# Altium footprint library SMDLibrary.PcbLib: 306 footprints (part 16 of 20)
Each footprint in its own frame and in the unit in brackets; x right, y up, seen from the top. Pads: shape width x height; smd on the part's side, far side on the other; paste and mask are expansions set on the pad; w line width, h text height; cw(c..) or ccw(c..) is an arc to the next point about the centre after c.
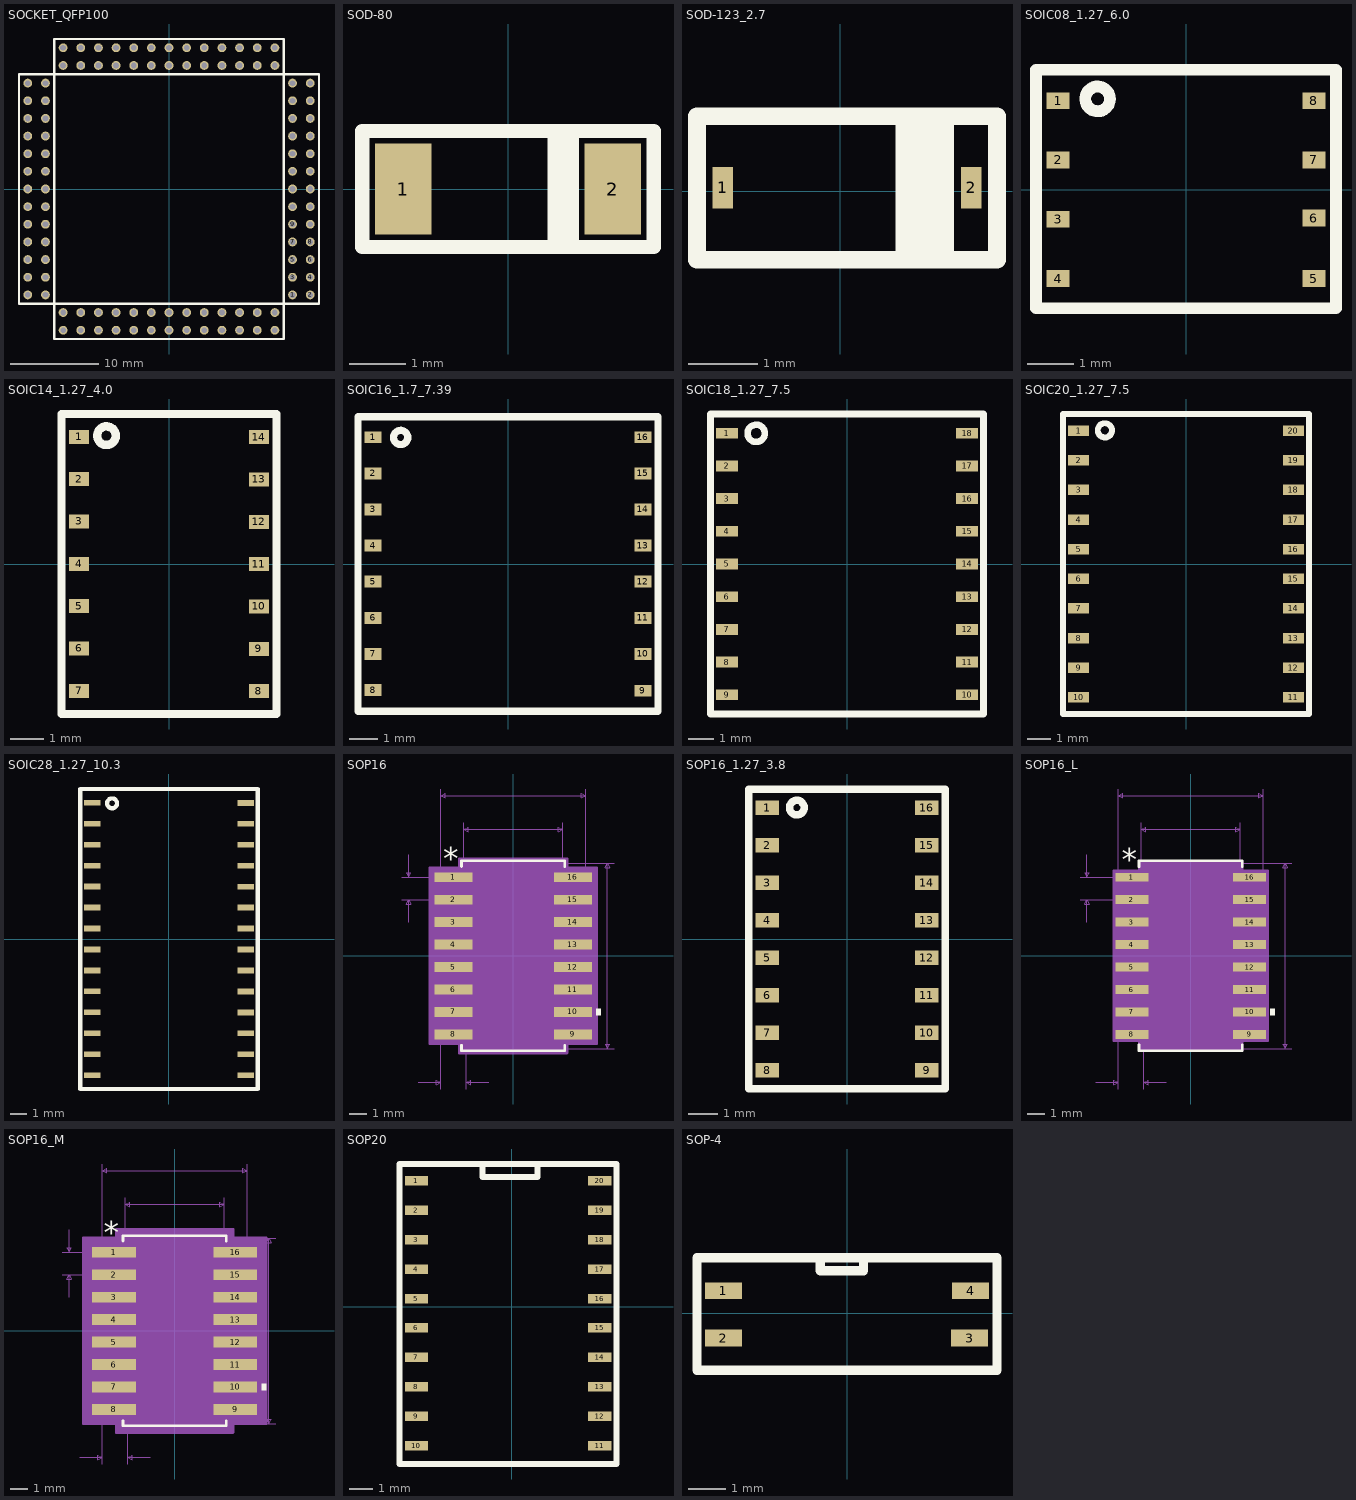
[diagram p15: the footprints below, top view; thin cyan lines are the x and y axes]

## SOCKET_QFP100 [mm]
pads (104):
  round 1 hole 0.65: 1(14,-12) 2(16,-12) 3(14,-10) 4(16,-10) 5(14,-8) 6(16,-8) 7(14,-6) 8(16,-6) 9(14,-4) 10(16,-4) 11(14,-2) 12(16,-2) 13(14,0) 14(16,0) 15(14,2) 16(16,2) 17(14,4) 18(16,4) 19(14,6) 20(16,6) 21(14,8) 22(16,8) 23(14,10) 24(16,10) 25(14,12) 26(12,14) 27(12,16) 28(10,14) 29(10,16) 30(8,14) 31(8,16) 32(6,14) 33(6,16) 34(4,14) 35(4,16) 36(2,14) 37(2,16) 38(0,14) 39(0,16) 40(-2,14) 41(-2,16) 42(-4,14) 43(-4,16) 44(-6,14) 45(-6,16) 46(-8,14) 47(-8,16) 48(-10,14) 49(-10,16) 50(-12,14) 51(-14,12) 52(-16,12) 53(-14,10) 54(-16,10) 55(-14,8) 56(-16,8) 57(-14,6) 58(-16,6) 59(-14,4) 60(-16,4) 61(-14,2) 62(-16,2) 63(-14,0) 64(-16,0) 65(-14,-2) 66(-16,-2) 67(-14,-4) 68(-16,-4) 69(-14,-6) 70(-16,-6) 71(-14,-8) 72(-16,-8) 73(-14,-10) 74(-16,-10) 75(-14,-12) 76(-12,-14) 77(-12,-16) 78(-10,-14) 79(-10,-16) 80(-8,-14) 81(-8,-16) 82(-6,-14) 83(-6,-16) 84(-4,-14) 85(-4,-16) 86(-2,-14) 87(-2,-16) 88(0,-14) 89(0,-16) 90(2,-14) 91(2,-16) 92(4,-14) 93(4,-16) 94(6,-14) 95(6,-16) 96(8,-14) 97(8,-16) 98(10,-14) 99(10,-16) 100(12,-14) NC(-16,-12) NC(-12,16) NC(12,-16) NC(16,12)
Top Overlay:
  lines w0.254: -2,13 2,13 ; 2,-13 -2,-13 ; -17,-13 -17,13 -13,13 ; -17,-13 -17,-13 ; -17,-13 -13,-13 ; -13,-13 -13,13 ; -13,-13 -13,-13 ; -13,-13 13,-13 ; -13,-13 -13,-17 13,-17 ; -13,13 13,13 ; -13,13 -13,17 ; -13,13 -13,13 ; -13,17 13,17 13,13 ; -13,17 -13,17 ; -2,-13 -2,-13 ; 2,13 2,13 ; 13,-17 13,-17 ; 13,-17 13,-13 ; 13,-13 13,-13 ; 13,-13 13,13 ; 13,-13 17,-13 17,13 ; 13,13 17,13 ; 13,13 13,13 ; 17,13 17,13
3D body "pin header 1x1 pitch 2mm heigth 5mm.stp": height 6.01, standoff -2.69, extent 11,15 13,17
3D body "pin header 1x1 pitch 2mm heigth 5mm.stp": height 6.01, standoff -2.69, extent -1,15 1,17
3D body "pin header 1x1 pitch 2mm heigth 5mm.stp": height 6.01, standoff -2.69, extent 1,15 3,17
3D body "pin header 1x1 pitch 2mm heigth 5mm.stp": height 6.01, standoff -2.69, extent 3,15 5,17
3D body "pin header 1x1 pitch 2mm heigth 5mm.stp": height 6.01, standoff -2.69, extent 5,15 7,17
3D body "pin header 1x1 pitch 2mm heigth 5mm.stp": height 6.01, standoff -2.69, extent 7,15 9,17
3D body "pin header 1x1 pitch 2mm heigth 5mm.stp": height 6.01, standoff -2.69, extent 9,15 11,17
3D body "pin header 1x1 pitch 2mm heigth 5mm.stp": height 6.01, standoff -2.69, extent -3,15 -1,17
3D body "pin header 1x1 pitch 2mm heigth 5mm.stp": height 6.01, standoff -2.69, extent -5,15 -3,17
3D body "pin header 1x1 pitch 2mm heigth 5mm.stp": height 6.01, standoff -2.69, extent -7,15 -5,17
3D body "pin header 1x1 pitch 2mm heigth 5mm.stp": height 6.01, standoff -2.69, extent -9,15 -7,17
3D body "pin header 1x1 pitch 2mm heigth 5mm.stp": height 6.01, standoff -2.69, extent -11,15 -9,17
3D body "pin header 1x1 pitch 2mm heigth 5mm.stp": height 6.01, standoff -2.69, extent -13,15 -11,17
3D body "pin header 1x1 pitch 2mm heigth 5mm.stp": height 6.01, standoff -2.69, extent 13,-13 15,-11
3D body "pin header 1x1 pitch 2mm heigth 5mm.stp": height 6.01, standoff -2.69, extent 15,-13 17,-11
3D body "pin header 1x1 pitch 2mm heigth 5mm.stp": height 6.01, standoff -2.69, extent 13,-1 15,1
3D body "pin header 1x1 pitch 2mm heigth 5mm.stp": height 6.01, standoff -2.69, extent 15,-1 17,1
3D body "pin header 1x1 pitch 2mm heigth 5mm.stp": height 6.01, standoff -2.69, extent 13,-3 15,-1
3D body "pin header 1x1 pitch 2mm heigth 5mm.stp": height 6.01, standoff -2.69, extent 15,-3 17,-1
3D body "pin header 1x1 pitch 2mm heigth 5mm.stp": height 6.01, standoff -2.69, extent 13,-5 15,-3
3D body "pin header 1x1 pitch 2mm heigth 5mm.stp": height 6.01, standoff -2.69, extent 13,-7 15,-5
3D body "pin header 1x1 pitch 2mm heigth 5mm.stp": height 6.01, standoff -2.69, extent 13,-9 15,-7
3D body "pin header 1x1 pitch 2mm heigth 5mm.stp": height 6.01, standoff -2.69, extent 15,-5 17,-3
3D body "pin header 1x1 pitch 2mm heigth 5mm.stp": height 6.01, standoff -2.69, extent 15,-7 17,-5
3D body "pin header 1x1 pitch 2mm heigth 5mm.stp": height 6.01, standoff -2.69, extent 15,-9 17,-7
3D body "pin header 1x1 pitch 2mm heigth 5mm.stp": height 6.01, standoff -2.69, extent 15,-11 17,-9
3D body "pin header 1x1 pitch 2mm heigth 5mm.stp": height 6.01, standoff -2.69, extent 13,-11 15,-9
3D body "pin header 1x1 pitch 2mm heigth 5mm.stp": height 6.01, standoff -2.69, extent 13,1 15,3
3D body "pin header 1x1 pitch 2mm heigth 5mm.stp": height 6.01, standoff -2.69, extent 15,1 17,3
3D body "pin header 1x1 pitch 2mm heigth 5mm.stp": height 6.01, standoff -2.69, extent 15,3 17,5
3D body "pin header 1x1 pitch 2mm heigth 5mm.stp": height 6.01, standoff -2.69, extent 15,5 17,7
3D body "pin header 1x1 pitch 2mm heigth 5mm.stp": height 6.01, standoff -2.69, extent 15,7 17,9
3D body "pin header 1x1 pitch 2mm heigth 5mm.stp": height 6.01, standoff -2.69, extent 13,3 15,5
3D body "pin header 1x1 pitch 2mm heigth 5mm.stp": height 6.01, standoff -2.69, extent 13,5 15,7
3D body "pin header 1x1 pitch 2mm heigth 5mm.stp": height 6.01, standoff -2.69, extent 13,7 15,9
3D body "pin header 1x1 pitch 2mm heigth 5mm.stp": height 6.01, standoff -2.69, extent 15,9 17,11
3D body "pin header 1x1 pitch 2mm heigth 5mm.stp": height 6.01, standoff -2.69, extent 13,9 15,11
3D body "pin header 1x1 pitch 2mm heigth 5mm.stp": height 6.01, standoff -2.69, extent 15,11 17,13
3D body "pin header 1x1 pitch 2mm heigth 5mm.stp": height 6.01, standoff -2.69, extent 13,11 15,13
3D body "pin header 1x1 pitch 2mm heigth 5mm.stp": height 6.01, standoff -2.69, extent 11,13 13,15
3D body "pin header 1x1 pitch 2mm heigth 5mm.stp": height 6.01, standoff -2.69, extent -1,13 1,15
3D body "pin header 1x1 pitch 2mm heigth 5mm.stp": height 6.01, standoff -2.69, extent 1,13 3,15
3D body "pin header 1x1 pitch 2mm heigth 5mm.stp": height 6.01, standoff -2.69, extent 3,13 5,15
3D body "pin header 1x1 pitch 2mm heigth 5mm.stp": height 6.01, standoff -2.69, extent 5,13 7,15
3D body "pin header 1x1 pitch 2mm heigth 5mm.stp": height 6.01, standoff -2.69, extent 7,13 9,15
3D body "pin header 1x1 pitch 2mm heigth 5mm.stp": height 6.01, standoff -2.69, extent 9,13 11,15
3D body "pin header 1x1 pitch 2mm heigth 5mm.stp": height 6.01, standoff -2.69, extent -3,13 -1,15
3D body "pin header 1x1 pitch 2mm heigth 5mm.stp": height 6.01, standoff -2.69, extent -5,13 -3,15
3D body "pin header 1x1 pitch 2mm heigth 5mm.stp": height 6.01, standoff -2.69, extent -7,13 -5,15
3D body "pin header 1x1 pitch 2mm heigth 5mm.stp": height 6.01, standoff -2.69, extent -9,13 -7,15
3D body "pin header 1x1 pitch 2mm heigth 5mm.stp": height 6.01, standoff -2.69, extent -11,13 -9,15
3D body "pin header 1x1 pitch 2mm heigth 5mm.stp": height 6.01, standoff -2.69, extent -13,13 -11,15
3D body "pin header 1x1 pitch 2mm heigth 5mm.stp": height 6.01, standoff -2.69, extent -15,11 -13,13
3D body "pin header 1x1 pitch 2mm heigth 5mm.stp": height 6.01, standoff -2.69, extent -17,11 -15,13
3D body "pin header 1x1 pitch 2mm heigth 5mm.stp": height 6.01, standoff -2.69, extent -15,-1 -13,1
3D body "pin header 1x1 pitch 2mm heigth 5mm.stp": height 6.01, standoff -2.69, extent -17,-1 -15,1
3D body "pin header 1x1 pitch 2mm heigth 5mm.stp": height 6.01, standoff -2.69, extent -15,1 -13,3
3D body "pin header 1x1 pitch 2mm heigth 5mm.stp": height 6.01, standoff -2.69, extent -17,1 -15,3
3D body "pin header 1x1 pitch 2mm heigth 5mm.stp": height 6.01, standoff -2.69, extent -15,3 -13,5
3D body "pin header 1x1 pitch 2mm heigth 5mm.stp": height 6.01, standoff -2.69, extent -15,5 -13,7
3D body "pin header 1x1 pitch 2mm heigth 5mm.stp": height 6.01, standoff -2.69, extent -15,7 -13,9
3D body "pin header 1x1 pitch 2mm heigth 5mm.stp": height 6.01, standoff -2.69, extent -17,3 -15,5
3D body "pin header 1x1 pitch 2mm heigth 5mm.stp": height 6.01, standoff -2.69, extent -17,5 -15,7
3D body "pin header 1x1 pitch 2mm heigth 5mm.stp": height 6.01, standoff -2.69, extent -17,7 -15,9
3D body "pin header 1x1 pitch 2mm heigth 5mm.stp": height 6.01, standoff -2.69, extent -17,9 -15,11
3D body "pin header 1x1 pitch 2mm heigth 5mm.stp": height 6.01, standoff -2.69, extent -15,9 -13,11
3D body "pin header 1x1 pitch 2mm heigth 5mm.stp": height 6.01, standoff -2.69, extent -15,-3 -13,-1
3D body "pin header 1x1 pitch 2mm heigth 5mm.stp": height 6.01, standoff -2.69, extent -17,-3 -15,-1
3D body "pin header 1x1 pitch 2mm heigth 5mm.stp": height 6.01, standoff -2.69, extent -17,-5 -15,-3
3D body "pin header 1x1 pitch 2mm heigth 5mm.stp": height 6.01, standoff -2.69, extent -17,-7 -15,-5
3D body "pin header 1x1 pitch 2mm heigth 5mm.stp": height 6.01, standoff -2.69, extent -17,-9 -15,-7
3D body "pin header 1x1 pitch 2mm heigth 5mm.stp": height 6.01, standoff -2.69, extent -15,-5 -13,-3
3D body "pin header 1x1 pitch 2mm heigth 5mm.stp": height 6.01, standoff -2.69, extent -15,-7 -13,-5
3D body "pin header 1x1 pitch 2mm heigth 5mm.stp": height 6.01, standoff -2.69, extent -15,-9 -13,-7
3D body "pin header 1x1 pitch 2mm heigth 5mm.stp": height 6.01, standoff -2.69, extent -17,-11 -15,-9
3D body "pin header 1x1 pitch 2mm heigth 5mm.stp": height 6.01, standoff -2.69, extent -15,-11 -13,-9
3D body "pin header 1x1 pitch 2mm heigth 5mm.stp": height 6.01, standoff -2.69, extent -17,-13 -15,-11
3D body "pin header 1x1 pitch 2mm heigth 5mm.stp": height 6.01, standoff -2.69, extent -15,-13 -13,-11
3D body "pin header 1x1 pitch 2mm heigth 5mm.stp": height 6.01, standoff -2.69, extent -13,-15 -11,-13
3D body "pin header 1x1 pitch 2mm heigth 5mm.stp": height 6.01, standoff -2.69, extent -13,-17 -11,-15
3D body "pin header 1x1 pitch 2mm heigth 5mm.stp": height 6.01, standoff -2.69, extent -1,-15 1,-13
3D body "pin header 1x1 pitch 2mm heigth 5mm.stp": height 6.01, standoff -2.69, extent -1,-17 1,-15
3D body "pin header 1x1 pitch 2mm heigth 5mm.stp": height 6.01, standoff -2.69, extent -3,-15 -1,-13
3D body "pin header 1x1 pitch 2mm heigth 5mm.stp": height 6.01, standoff -2.69, extent -3,-17 -1,-15
3D body "pin header 1x1 pitch 2mm heigth 5mm.stp": height 6.01, standoff -2.69, extent -5,-15 -3,-13
3D body "pin header 1x1 pitch 2mm heigth 5mm.stp": height 6.01, standoff -2.69, extent -7,-15 -5,-13
3D body "pin header 1x1 pitch 2mm heigth 5mm.stp": height 6.01, standoff -2.69, extent -9,-15 -7,-13
3D body "pin header 1x1 pitch 2mm heigth 5mm.stp": height 6.01, standoff -2.69, extent -5,-17 -3,-15
3D body "pin header 1x1 pitch 2mm heigth 5mm.stp": height 6.01, standoff -2.69, extent -7,-17 -5,-15
3D body "pin header 1x1 pitch 2mm heigth 5mm.stp": height 6.01, standoff -2.69, extent -9,-17 -7,-15
3D body "pin header 1x1 pitch 2mm heigth 5mm.stp": height 6.01, standoff -2.69, extent -11,-17 -9,-15
3D body "pin header 1x1 pitch 2mm heigth 5mm.stp": height 6.01, standoff -2.69, extent -11,-15 -9,-13
3D body "pin header 1x1 pitch 2mm heigth 5mm.stp": height 6.01, standoff -2.69, extent 1,-15 3,-13
3D body "pin header 1x1 pitch 2mm heigth 5mm.stp": height 6.01, standoff -2.69, extent 1,-17 3,-15
3D body "pin header 1x1 pitch 2mm heigth 5mm.stp": height 6.01, standoff -2.69, extent 3,-17 5,-15
3D body "pin header 1x1 pitch 2mm heigth 5mm.stp": height 6.01, standoff -2.69, extent 5,-17 7,-15
3D body "pin header 1x1 pitch 2mm heigth 5mm.stp": height 6.01, standoff -2.69, extent 7,-17 9,-15
3D body "pin header 1x1 pitch 2mm heigth 5mm.stp": height 6.01, standoff -2.69, extent 3,-15 5,-13
3D body "pin header 1x1 pitch 2mm heigth 5mm.stp": height 6.01, standoff -2.69, extent 5,-15 7,-13
3D body "pin header 1x1 pitch 2mm heigth 5mm.stp": height 6.01, standoff -2.69, extent 7,-15 9,-13
3D body "pin header 1x1 pitch 2mm heigth 5mm.stp": height 6.01, standoff -2.69, extent 9,-17 11,-15
3D body "pin header 1x1 pitch 2mm heigth 5mm.stp": height 6.01, standoff -2.69, extent 9,-15 11,-13
3D body "pin header 1x1 pitch 2mm heigth 5mm.stp": height 6.01, standoff -2.69, extent 11,-17 13,-15
3D body "pin header 1x1 pitch 2mm heigth 5mm.stp": height 6.01, standoff -2.69, extent 11,-15 13,-13

## SOD-80 [mm]
pads (2):
  rect 1x1.6 smd: 1(-1.85,0) 2(1.85,0)
Top Overlay:
  rectangle: 0.7,-0.9 1.25,0.925
  lines w0.254: -2.575,-1.025 -2.575,1.025 2.575,1.025 2.575,-1.025 -2.575,-1.025
3D body "User Library-MiniMelf-2.STEP": height 1.6, standoff 0, extent -1.82,-0.8 1.88,0.8

## SOD-123_2.7 [mm]
pads (2):
  rect 0.3x0.6 smd: 1(-1.7,0.05) 2(1.9,0.05)
Top Overlay:
  rectangle: 0.8,-1.025 1.65,1.075
  lines w0.254: -2.075,-0.991 2.275,-0.991 2.275,1.092 -2.075,1.092 -2.075,-0.991
3D body "User Library-SOD123-1.STEP": height 1.18, standoff 0, extent -1.85,-0.85 2.05,0.95

## SOIC08_1.27_6.0 [mm]
pads (8):
  rect 0.5x0.36 smd: 1(-2.75,1.913) 2(-2.75,0.637) 3(-2.75,-0.637) 4(-2.75,-1.913) 5(2.75,-1.913) 6(2.75,-0.613) 7(2.75,0.637) 8(2.75,1.913)
Top Overlay:
  circle w0.254: c-1.9,1.95 r0.266
  lines w0.254: -3.225,-2.553 3.225,-2.553 3.225,2.578 -3.225,2.578 -3.225,-2.553
3D body "User Library-SOIC-8-1.STEP": height 1.75, standoff 0, extent -3,-2.45 3,2.45

## SOIC14_1.27_4.0 [mm]
pads (14):
  rect 0.6x0.42 smd: 1(-2.7,3.815) 2(-2.7,2.545) 3(-2.7,1.275) 4(-2.7,0.005) 5(-2.7,-1.265) 6(-2.7,-2.535) 7(-2.7,-3.805) 8(2.7,-3.815) 9(2.7,-2.545) 10(2.7,-1.275) 11(2.7,-0.005) 12(2.7,1.265) 13(2.7,2.535) 14(2.7,3.805)
Top Overlay:
  circle w0.254: c-1.875,3.85 r0.28
  lines w0.254: -3.225,-4.5 -3.225,4.5 3.225,4.5 3.225,-4.5 -3.225,-4.5
3D body "User Library-SOIC-14.STEP": height 1.75, standoff 0, extent -3,-4.375 3,4.375

## SOIC16_1.7_7.39 [mm]
pads (16):
  rect 0.6x0.42 smd: 1(-4.74,4.457) 2(-4.74,3.187) 3(-4.74,1.917) 4(-4.74,0.647) 5(-4.74,-0.623) 6(-4.74,-1.893) 7(-4.74,-3.163) 8(-4.74,-4.433) 9(4.74,-4.457) 10(4.74,-3.162) 11(4.74,-1.892) 12(4.74,-0.622) 13(4.74,0.648) 14(4.74,1.918) 15(4.74,3.188) 16(4.74,4.458)
Top Overlay:
  circle w0.254: c-3.775,4.45 r0.25
  lines w0.254: -5.275,-5.175 -5.275,5.175 5.275,5.175 5.275,-5.175 -5.275,-5.175
3D body "SOIC16 wide.stp": height 2, standoff 0, extent -5.082,-5.04 5.081,5.04

## SOIC18_1.27_7.5 [mm]
pads (18):
  rect 0.84x0.42 smd: 1(-4.661,5.08) 2(-4.661,3.81) 3(-4.661,2.54) 4(-4.661,1.27) 5(-4.661,0) 6(-4.661,-1.27) 7(-4.661,-2.54) 8(-4.661,-3.81) 9(-4.661,-5.08) 10(4.661,-5.08) 11(4.661,-3.81) 12(4.661,-2.54) 13(4.661,-1.27) 14(4.661,0) 15(4.661,1.27) 16(4.661,2.54) 17(4.661,3.81) 18(4.661,5.08)
Top Overlay:
  circle w0.254: c-3.525,5.075 r0.336
  lines w0.254: -5.3,-5.825 -5.3,5.825 5.3,5.825 5.3,-5.825 -5.3,-5.825
3D body "SOIC18 wide.stp": height 2, standoff 0, extent -5.082,-5.675 5.082,5.675

## SOIC20_1.27_7.5 [mm]
pads (20):
  rect 0.9x0.45 smd: 1(-4.6,5.715) 2(-4.6,4.445) 3(-4.6,3.175) 4(-4.6,1.905) 5(-4.6,0.635) 6(-4.6,-0.635) 7(-4.6,-1.905) 8(-4.6,-3.175) 9(-4.6,-4.445) 10(-4.6,-5.715) 11(4.6,-5.715) 12(4.6,-4.445) 13(4.6,-3.175) 14(4.6,-1.905) 15(4.6,-0.635) 16(4.6,0.635) 17(4.6,1.905) 18(4.6,3.175) 19(4.6,4.445) 20(4.6,5.715)
Top Overlay:
  circle w0.254: c-3.475,5.725 r0.305
  lines w0.254: -5.275,-6.425 5.275,-6.425 5.275,6.425 -5.275,6.425 -5.275,-6.425
3D body "User Library-SOIC20.STEP": height 2.2, standoff -0.04, extent -5.067,-6.3 5.067,6.3

## SOIC28_1.27_10.3 [mm]
pads (28):
  rect 1x0.35 smd: 1(-4.65,8.258) 2(-4.65,6.988) 3(-4.65,5.718) 4(-4.65,4.448) 5(-4.65,3.178) 6(-4.65,1.908) 7(-4.65,0.638) 8(-4.65,-0.632) 9(-4.65,-1.902) 10(-4.65,-3.172) 11(-4.65,-4.442) 12(-4.65,-5.712) 13(-4.65,-6.982) 14(-4.65,-8.252) 15(4.65,-8.257) 16(4.65,-6.987) 17(4.65,-5.717) 18(4.65,-4.447) 19(4.65,-3.177) 20(4.65,-1.907) 21(4.65,-0.637) 22(4.65,0.633) 23(4.65,1.903) 24(4.65,3.173) 25(4.65,4.443) 26(4.65,5.713) 27(4.65,6.983) 28(4.65,8.253)
Top Overlay:
  circle w0.254: c-3.45,8.225 r0.301
  lines w0.254: -5.375,-9.093 5.375,-9.093 5.375,9.094 -5.375,9.094 -5.375,-9.093
3D body "SW3dPS-SOIC28-300.STEP": height 2.65, standoff 0, extent -5.153,-8.953 5.147,8.947

## SOP16 [mil]
pads (16):
  rect 85x22 smd paste+0 mask+0: 1(-133,175) 2(-133,125) 3(-133,75) 4(-133,25) 5(-133,-25) 6(-133,-75) 7(-133,-125) 8(-133,-175) 9(133,-175) 10(133,-125) 11(133,-75) 12(133,-25) 13(133,25) 14(133,75) 15(133,125) 16(133,175)
Top Overlay:
  region: 185.5,-117.5 195.5,-117.5 195.5,-132.5 185.5,-132.5
  lines w6: -115,-199.1 -115,-211.5 115,-211.5 115,-199.1 ; -115,199.1 -115,211.5 115,211.5 115,199.1
  text "*" at -155.5,192 h50
Mechanical 7:
  lines w1: -248,125 -133,125 ; -248,175 -133,175 ; -233,75 -233,125 ; -233,225 -233,175 ; -211.5,-281.5 -161.5,-281.5 ; -161.5,-296.5 -161.5,0 -161.5,371.5 ; -110,0 -110,296.5 ; -104.5,-296.5 -104.5,0 ; -54.5,-281.5 -104.5,-281.5 ; 0,-206.5 225,-206.5 ; 0,206.5 225,206.5 ; 110,0 110,296.5 ; 161.5,0 161.5,371.5 ; -233,125 -228,115 -238,115 -233,125 ; -233,175 -228,185 -238,185 -233,175 ; -161.5,-281.5 -171.5,-286.5 -171.5,-276.5 -161.5,-281.5 ; -161.5,356.5 -151.5,351.5 -151.5,361.5 -161.5,356.5 ; -161.5,356.5 161.5,356.5 ; -110,281.5 -100,276.5 -100,286.5 -110,281.5 ; -110,281.5 110,281.5 ; -104.5,-281.5 -94.5,-286.5 -94.5,-276.5 -104.5,-281.5 ; 110,281.5 100,276.5 100,286.5 110,281.5 ; 161.5,356.5 151.5,351.5 151.5,361.5 161.5,356.5 ; 210,-206.5 215,-196.5 205,-196.5 210,-206.5 ; 210,-206.5 210,206.5 ; 210,206.5 215,196.5 205,196.5 210,206.5
  text "0.041in/1.041mm" at -226.75,-326.5 h25
  text "0.05in/1.27mm" at -415.5,137.5 h25
  text "0.413in/10.49mm" at 230,-12.5 h25
  text "0.323in/8.204mm" at -93.75,376.5 h25
  text "0.22in/5.588mm" at -87.5,301.5 h25
  text "Alt 2 Padstyle: OX90Y60D30P" at -337.5,-706.5 h50
  text "Alt 1 Padstyle: OX60Y90D30P" at -337.5,-646.5 h50
  text "Pin One Padstyle: RX85Y22D0T" at -350,-466.5 h50
  text "Default Padstyle: RX85Y22D0T" at -350,-406.5 h50
Mechanical 13:
  lines w0: -12,206.5 ccw(c0,206.5) 12,206.5
  lines w1: -161.5,-185 -110,-185 -110,-165 -161.5,-165 -161.5,-185 ; -161.5,-135 -110,-135 -110,-115 -161.5,-115 -161.5,-135 ; -161.5,-85 -110,-85 -110,-65 -161.5,-65 -161.5,-85 ; -161.5,-35 -110,-35 -110,-15 -161.5,-15 -161.5,-35 ; -161.5,15 -110,15 -110,35 -161.5,35 -161.5,15 ; -161.5,65 -110,65 -110,85 -161.5,85 -161.5,65 ; -161.5,115 -110,115 -110,135 -161.5,135 -161.5,115 ; -161.5,165 -110,165 -110,185 -161.5,185 -161.5,165 ; -110,-206.5 -110,206.5 110,206.5 110,-206.5 -110,-206.5 ; 110,-185 161.5,-185 161.5,-165 110,-165 110,-185 ; 110,-135 161.5,-135 161.5,-115 110,-115 110,-135 ; 110,-85 161.5,-85 161.5,-65 110,-65 110,-85 ; 110,-35 161.5,-35 161.5,-15 110,-15 110,-35 ; 110,15 161.5,15 161.5,35 110,35 110,15 ; 110,65 161.5,65 161.5,85 110,85 110,65 ; 110,115 161.5,115 161.5,135 110,135 110,115 ; 110,165 161.5,165 161.5,185 110,185 110,165
  text "*" at -107.5,153.5 h50
Mechanical 15:
  region: -120,-196 -185.5,-196 -185.5,196 -120,196 -120,216.5 120,216.5 120,196 185.5,196 185.5,-196 120,-196 120,-216.5 -120,-216.5
  lines w6: -185.5,-196 -120,-196 -120,-216.5 120,-216.5 120,-196 185.5,-196 185.5,196 120,196 120,216.5 -120,216.5 -120,196 -185.5,196 -185.5,-196
3D body: height 10, standoff 0, extent 0,0 10,10
3D body "NS16.step": height 79.09, standoff 0, extent -161.49,-206.49 161.51,206.5

## SOP16_1.27_3.8 [mm]
pads (16):
  rect 0.8x0.5 smd: 1(-2.7,4.445) 2(-2.7,3.175) 3(-2.7,1.905) 4(-2.7,0.635) 5(-2.7,-0.635) 6(-2.7,-1.905) 7(-2.7,-3.175) 8(-2.7,-4.445) 9(2.7,-4.445) 10(2.7,-3.175) 11(2.7,-1.905) 12(2.7,-0.635) 13(2.7,0.635) 14(2.7,1.905) 15(2.7,3.175) 16(2.7,4.445)
Top Overlay:
  circle w0.254: c-1.7,4.45 r0.247
  lines w0.254: -3.325,-5.08 -3.325,5.08 3.325,5.08 3.325,-5.08 -3.325,-5.08
3D body "User Library-SOP16.STEP": height 1.59, standoff 0, extent -3.117,-4.991 3.117,4.99

## SOP16_L [mil]
pads (16):
  rect 73x20 smd paste+0 mask+0: 1(-131,175) 2(-131,125) 3(-131,75) 4(-131,25) 5(-131,-25) 6(-131,-75) 7(-131,-125) 8(-131,-175) 9(131,-175) 10(131,-125) 11(131,-75) 12(131,-25) 13(131,25) 14(131,75) 15(131,125) 16(131,175)
Top Overlay:
  region: 177.5,-117.5 187.5,-117.5 187.5,-132.5 177.5,-132.5
  lines w6: -115,-198.1 -115,-211.5 115,-211.5 115,-198.1 ; -115,198.1 -115,211.5 115,211.5 115,198.1
  text "*" at -153.5,190 h50
Mechanical 7:
  lines w1: -246,125 -131,125 ; -246,175 -131,175 ; -231,75 -231,125 ; -231,225 -231,175 ; -211.5,-281.5 -161.5,-281.5 ; -161.5,-296.5 -161.5,0 -161.5,371.5 ; -110,0 -110,296.5 ; -104.5,-296.5 -104.5,0 ; -54.5,-281.5 -104.5,-281.5 ; 0,-206.5 225,-206.5 ; 0,206.5 225,206.5 ; 110,0 110,296.5 ; 161.5,0 161.5,371.5 ; -231,125 -236,115 -226,115 -231,125 ; -231,175 -236,185 -226,185 -231,175 ; -161.5,-281.5 -171.5,-276.5 -171.5,-286.5 -161.5,-281.5 ; -161.5,356.5 161.5,356.5 ; -161.5,356.5 -151.5,361.5 -151.5,351.5 -161.5,356.5 ; -110,281.5 110,281.5 ; -110,281.5 -100,286.5 -100,276.5 -110,281.5 ; -104.5,-281.5 -94.5,-276.5 -94.5,-286.5 -104.5,-281.5 ; 110,281.5 100,286.5 100,276.5 110,281.5 ; 161.5,356.5 151.5,361.5 151.5,351.5 161.5,356.5 ; 210,-206.5 210,206.5 ; 210,-206.5 205,-196.5 215,-196.5 210,-206.5 ; 210,206.5 205,196.5 215,196.5 210,206.5
  text "Default Padstyle: RX73Y20D0T" at -350,-406.5 h50
  text "Pin One Padstyle: RX73Y20D0T" at -350,-466.5 h50
  text "Alt 1 Padstyle: OX60Y90D30P" at -337.5,-646.5 h50
  text "Alt 2 Padstyle: OX90Y60D30P" at -337.5,-706.5 h50
  text "0.22in/5.588mm" at -87.5,301.5 h25
  text "0.323in/8.204mm" at -93.75,376.5 h25
  text "0.413in/10.49mm" at 230,-12.5 h25
  text "0.05in/1.27mm" at -413.5,137.5 h25
  text "0.041in/1.041mm" at -226.75,-326.5 h25
Mechanical 13:
  lines w0: -12,206.5 ccw(c0,206.5) 12,206.5
  lines w1: -161.5,-185 -161.5,-165 -110,-165 -110,-185 -161.5,-185 ; -161.5,-135 -161.5,-115 -110,-115 -110,-135 -161.5,-135 ; -161.5,-85 -161.5,-65 -110,-65 -110,-85 -161.5,-85 ; -161.5,-35 -161.5,-15 -110,-15 -110,-35 -161.5,-35 ; -161.5,15 -161.5,35 -110,35 -110,15 -161.5,15 ; -161.5,65 -161.5,85 -110,85 -110,65 -161.5,65 ; -161.5,115 -161.5,135 -110,135 -110,115 -161.5,115 ; -161.5,165 -161.5,185 -110,185 -110,165 -161.5,165 ; -110,-206.5 110,-206.5 110,206.5 -110,206.5 -110,-206.5 ; 110,-185 110,-165 161.5,-165 161.5,-185 110,-185 ; 110,-135 110,-115 161.5,-115 161.5,-135 110,-135 ; 110,-85 110,-65 161.5,-65 161.5,-85 110,-85 ; 110,-35 110,-15 161.5,-15 161.5,-35 110,-35 ; 110,15 110,35 161.5,35 161.5,15 110,15 ; 110,65 110,85 161.5,85 161.5,65 110,65 ; 110,115 110,135 161.5,135 161.5,115 110,115 ; 110,165 110,185 161.5,185 161.5,165 110,165
  text "*" at -107.5,153.5 h50
Mechanical 15:
  region: -114,-189 -171.5,-189 -171.5,189 -114,189 -114,210.5 114,210.5 114,189 171.5,189 171.5,-189 114,-189 114,-210.5 -114,-210.5
  lines w6: -171.5,-189 -171.5,189 -114,189 -114,210.5 114,210.5 114,189 171.5,189 171.5,-189 114,-189 114,-210.5 -114,-210.5 -114,-189 -171.5,-189
3D body: height 10, standoff 0, extent 0,0 10,10
3D body "NS16-L.step": height 79.09, standoff 0, extent -161.49,-206.49 161.51,206.5

## SOP16_M [mil]
pads (16):
  rect 97x24 smd paste+0 mask+0: 1(-135,175) 2(-135,125) 3(-135,75) 4(-135,25) 5(-135,-25) 6(-135,-75) 7(-135,-125) 8(-135,-175) 9(135,-175) 10(135,-125) 11(135,-75) 12(135,-25) 13(135,25) 14(135,75) 15(135,125) 16(135,175)
Top Overlay:
  region: 193.5,-117.5 203.5,-117.5 203.5,-132.5 193.5,-132.5
  lines w6: -115,-200.1 -115,-211.5 115,-211.5 115,-200.1 ; -115,200.1 -115,211.5 115,211.5 115,200.1
  text "*" at -157.5,194 h50
Mechanical 7:
  lines w1: -250,125 -135,125 ; -250,175 -135,175 ; -235,75 -235,125 ; -235,225 -235,175 ; -211.5,-281.5 -161.5,-281.5 ; -161.5,-296.5 -161.5,0 -161.5,371.5 ; -110,0 -110,296.5 ; -104.5,-296.5 -104.5,0 ; -54.5,-281.5 -104.5,-281.5 ; 0,-206.5 225,-206.5 ; 0,206.5 225,206.5 ; 110,0 110,296.5 ; 161.5,0 161.5,371.5 ; -235,125 -240,115 -230,115 -235,125 ; -235,175 -240,185 -230,185 -235,175 ; -161.5,-281.5 -171.5,-276.5 -171.5,-286.5 -161.5,-281.5 ; -161.5,356.5 161.5,356.5 ; -161.5,356.5 -151.5,361.5 -151.5,351.5 -161.5,356.5 ; -110,281.5 110,281.5 ; -110,281.5 -100,286.5 -100,276.5 -110,281.5 ; -104.5,-281.5 -94.5,-276.5 -94.5,-286.5 -104.5,-281.5 ; 110,281.5 100,286.5 100,276.5 110,281.5 ; 161.5,356.5 151.5,361.5 151.5,351.5 161.5,356.5 ; 210,-206.5 210,206.5 ; 210,-206.5 205,-196.5 215,-196.5 210,-206.5 ; 210,206.5 205,196.5 215,196.5 210,206.5
  text "Default Padstyle: RX97Y24D0T" at -350,-406.5 h50
  text "Pin One Padstyle: RX97Y24D0T" at -350,-466.5 h50
  text "Alt 1 Padstyle: OX60Y90D30P" at -337.5,-646.5 h50
  text "Alt 2 Padstyle: OX90Y60D30P" at -337.5,-706.5 h50
  text "0.22in/5.588mm" at -87.5,301.5 h25
  text "0.323in/8.204mm" at -93.75,376.5 h25
  text "0.413in/10.49mm" at 230,-12.5 h25
  text "0.05in/1.27mm" at -417.5,137.5 h25
  text "0.041in/1.041mm" at -226.75,-326.5 h25
Mechanical 13:
  lines w0: -12,206.5 ccw(c0,206.5) 12,206.5
  lines w1: -161.5,-185 -161.5,-165 -110,-165 -110,-185 -161.5,-185 ; -161.5,-135 -161.5,-115 -110,-115 -110,-135 -161.5,-135 ; -161.5,-85 -161.5,-65 -110,-65 -110,-85 -161.5,-85 ; -161.5,-35 -161.5,-15 -110,-15 -110,-35 -161.5,-35 ; -161.5,15 -161.5,35 -110,35 -110,15 -161.5,15 ; -161.5,65 -161.5,85 -110,85 -110,65 -161.5,65 ; -161.5,115 -161.5,135 -110,135 -110,115 -161.5,115 ; -161.5,165 -161.5,185 -110,185 -110,165 -161.5,165 ; -110,-206.5 110,-206.5 110,206.5 -110,206.5 -110,-206.5 ; 110,-185 110,-165 161.5,-165 161.5,-185 110,-185 ; 110,-135 110,-115 161.5,-115 161.5,-135 110,-135 ; 110,-85 110,-65 161.5,-65 161.5,-85 110,-85 ; 110,-35 110,-15 161.5,-15 161.5,-35 110,-35 ; 110,15 110,35 161.5,35 161.5,15 110,15 ; 110,65 110,85 161.5,85 161.5,65 110,65 ; 110,115 110,135 161.5,135 161.5,115 110,115 ; 110,165 110,185 161.5,185 161.5,165 110,165
  text "*" at -107.5,153.5 h50
Mechanical 15:
  region: -130,-207 -203.5,-207 -203.5,207 -130,207 -130,226.5 130,226.5 130,207 203.5,207 203.5,-207 130,-207 130,-226.5 -130,-226.5
  lines w6: -203.5,-207 -203.5,207 -130,207 -130,226.5 130,226.5 130,207 203.5,207 203.5,-207 130,-207 130,-226.5 -130,-226.5 -130,-207 -203.5,-207
3D body "NS16-M.step": height 79.09, standoff 0, extent -161.49,-206.49 161.51,206.51
3D body: height 10, standoff 0, extent 0,0 10,10

## SOP20 [mm]
pads (20):
  rect 1x0.41 smd: 1(-4.1,5.43) 2(-4.1,4.16) 3(-4.1,2.89) 4(-4.1,1.62) 5(-4.1,0.35) 6(-4.1,-0.92) 7(-4.1,-2.19) 8(-4.1,-3.46) 9(-4.1,-4.73) 10(-4.1,-6) 11(3.799,-6) 12(3.799,-4.73) 13(3.799,-3.46) 14(3.799,-2.19) 15(3.799,-0.92) 16(3.799,0.35) 17(3.799,1.62) 18(3.799,2.89) 19(3.799,4.16) 20(3.799,5.43)
Top Overlay:
  lines w0.254: -1.25,6.121 -1.25,5.588 1.125,5.588 1.125,6.147 ; -4.826,-6.782 -4.826,6.147 4.521,6.147 4.521,-6.782 -4.826,-6.782
3D body "User Library-SOP20.STEP": height 2, standoff 0, extent -4.227,-6.648 3.873,6.052

## SOP-4 [mm]
pads (4):
  rect 1x0.45 smd: 1(-3.35,0.6) 2(-3.35,-0.675) 3(3.3,-0.675) 4(3.325,0.6)
Top Overlay:
  lines w0.254: -0.737,1.499 -0.737,1.143 0.127,1.143 0.432,1.143 0.432,1.499 ; -4.064,-1.549 -4.064,1.499 4.039,1.499 4.039,-1.549 -4.064,-1.549
3D body "User Library-SOP-4-1.STEP": height 2.1, standoff 0, extent -3.5,-1.425 3.5,1.375

## SOP-4L/TCLT100 [mm]
3D body "User Library-TCLT100-SOP4L.STEP": height 1, standoff -1.12, extent -5.1,-2.05 5.1,2.05